# Altium footprint library Connectors THD.PcbLib: 631 footprints (part 19 of 46)
Each footprint in its own frame and in the unit in brackets; x right, y up, seen from the top. Pads: shape width x height; smd on the part's side, far side on the other; paste and mask are expansions set on the pad; w line width, h text height; cw(c..) or ccw(c..) is an arc to the next point about the centre after c.
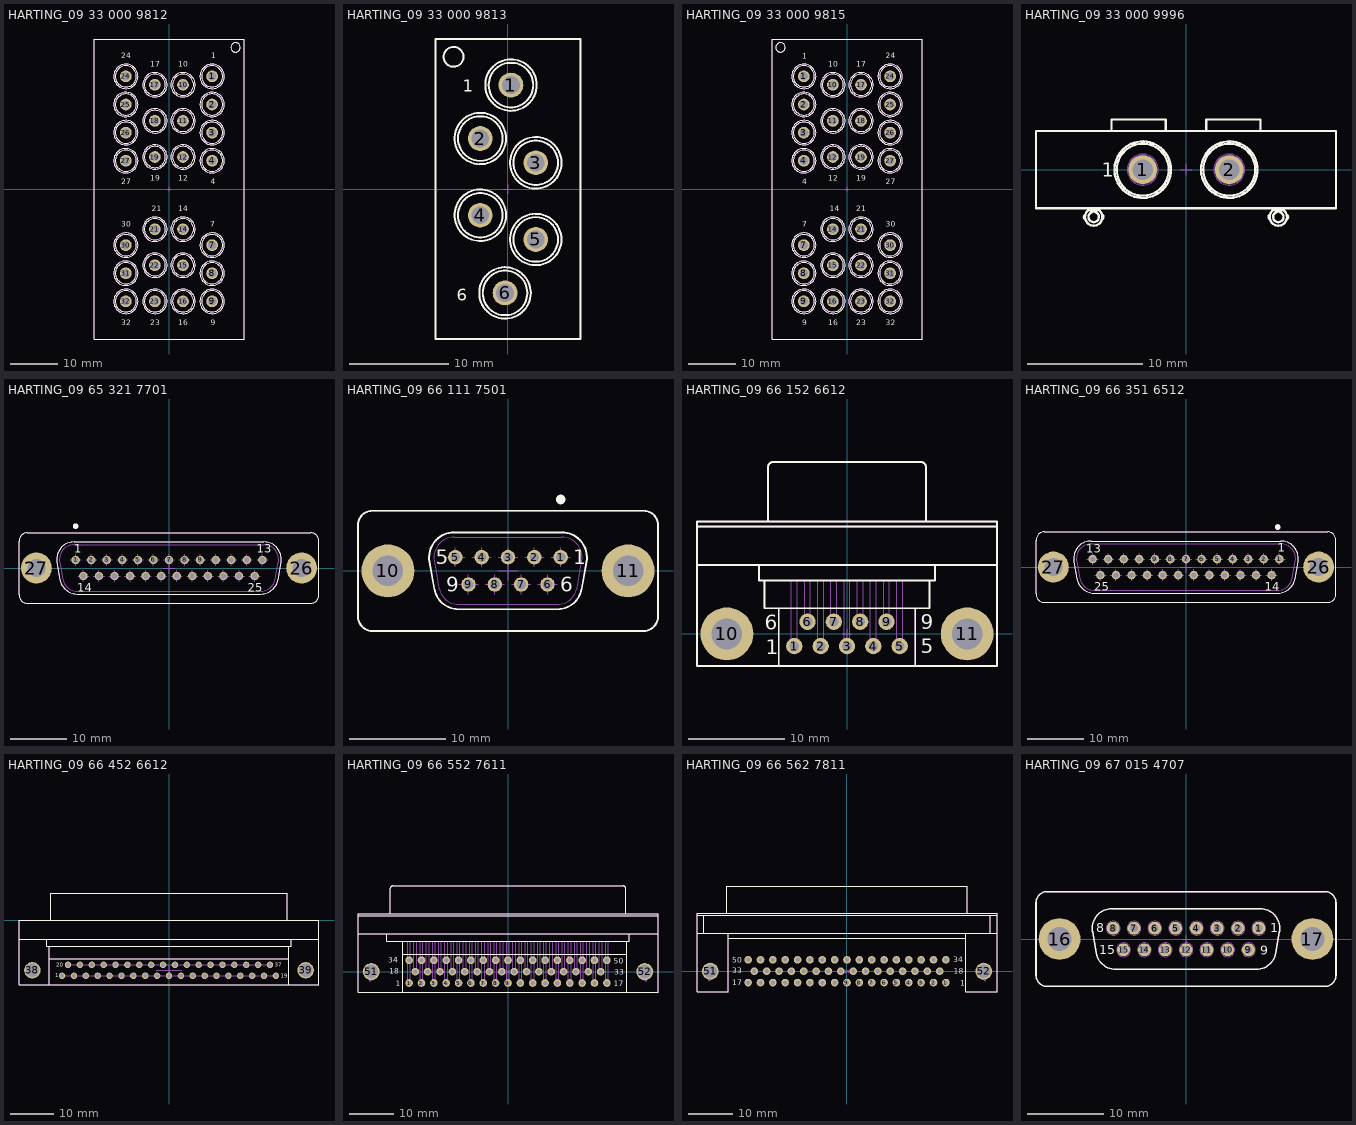
[diagram p18: the footprints below, top view; thin cyan lines are the x and y axes]

## HARTING_09 33 000 9812 [mm] "Han 32EE-f PCB Matrix With Contacts"
height 26
pads (26):
  round 2.5 hole 1.8: 1(9.193,24.026) 2(9.193,18.026) 3(9.193,12.026) 4(9.193,6.026) 7(9.193,-11.974) 8(9.193,-17.974) 9(9.193,-23.974) 10(2.993,22.226) 11(2.993,14.526) 12(2.993,6.826) 14(2.993,-8.574) 15(2.993,-16.274) 16(2.993,-23.974) 17(-3.007,22.226) 18(-3.007,14.526) 19(-3.007,6.826) 21(-3.007,-8.574) 22(-3.007,-16.274) 23(-3.007,-23.974) 24(-9.207,24.026) 25(-9.207,18.026) 26(-9.207,12.026) 27(-9.207,6.026) 30(-9.207,-11.974) 31(-9.207,-17.974) 32(-9.207,-23.974)
Top Overlay:
  circle w0.2: c9.193,-23.974 r2.25
  circle w0.2: c2.993,-23.974 r2.25
  circle w0.2: c-3.007,-23.974 r2.25
  circle w0.2: c-9.207,-23.974 r2.25
  circle w0.2: c-9.207,-17.974 r2.25
  circle w0.2: c-3.007,-16.274 r2.25
  circle w0.2: c2.993,-16.274 r2.25
  circle w0.2: c9.193,-17.974 r2.25
  circle w0.2: c9.193,-11.974 r2.25
  circle w0.2: c-9.207,-11.974 r2.25
  circle w0.2: c-3.007,-8.574 r2.25
  circle w0.2: c2.993,-8.574 r2.25
  circle w0.2: c9.193,6.026 r2.25
  circle w0.2: c2.993,6.826 r2.25
  circle w0.2: c-3.007,6.826 r2.25
  circle w0.2: c-9.207,6.026 r2.25
  circle w0.2: c-9.207,12.026 r2.25
  circle w0.2: c-3.007,14.526 r2.25
  circle w0.2: c9.193,12.026 r2.25
  circle w0.2: c2.993,14.526 r2.25
  circle w0.2: c9.193,18.026 r2.25
  circle w0.2: c9.193,24.026 r2.25
  circle w0.2: c2.993,22.226 r2.25
  circle w0.2: c-3.007,22.226 r2.25
  circle w0.2: c-9.207,24.026 r2.25
  circle w0.2: c-9.207,24.026 r2.6
  circle w0.2: c-3.007,22.226 r2.6
  circle w0.2: c2.993,22.226 r2.6
  circle w0.2: c9.193,24.026 r2.6
  circle w0.2: c9.193,18.026 r2.6
  circle w0.2: c9.193,12.026 r2.6
  circle w0.2: c9.193,6.026 r2.6
  circle w0.2: c2.993,6.826 r2.6
  circle w0.2: c2.993,14.526 r2.6
  circle w0.2: c-3.007,14.526 r2.6
  circle w0.2: c-9.207,12.026 r2.6
  circle w0.2: c-3.007,6.826 r2.6
  circle w0.2: c-9.207,6.026 r2.6
  circle w0.2: c2.993,-8.574 r2.6
  circle w0.2: c9.193,-11.974 r2.6
  circle w0.2: c9.193,-17.974 r2.6
  circle w0.2: c9.193,-23.974 r2.6
  circle w0.2: c2.993,-16.274 r2.6
  circle w0.2: c2.993,-23.974 r2.6
  circle w0.2: c-3.007,-23.974 r2.6
  circle w0.2: c-3.007,-16.274 r2.6
  circle w0.2: c-3.007,-8.574 r2.6
  circle w0.2: c-9.207,-11.974 r2.6
  circle w0.2: c-9.207,-17.974 r2.6
  circle w0.2: c-9.207,-23.974 r2.6
  circle w0.2: c-9.207,18.026 r2.25
  circle w0.2: c-9.207,18.026 r2.6
  circle w0.2: c14.2,30.2 r1
  lines w0.2: -16,-32 16,-32 16,32 -16,32 -16,-32
  text "32" at -10.175,-29.026 h1.2
  text "30" at -10.175,-8.101 h1.2
  text "27" at -10.175,0.974 h1.2
  text "24" at -10.175,27.899 h1.2
  text "1" at 9.05,27.899 h1.2
  text "14" at 2.025,-4.701 h1.2
  text "21" at -3.725,-4.701 h1.2
  text "19" at -3.975,1.774 h1.2
  text "12" at 2.025,1.774 h1.2
  text "17" at -3.975,26.099 h1.2
  text "10" at 2.025,26.099 h1.2
  text "16" at 2.025,-29.026 h1.2
  text "23" at -3.975,-29.026 h1.2
  text "4" at 8.875,0.974 h1.2
  text "7" at 8.825,-8.101 h1.2
  text "9" at 8.875,-29.026 h1.2
Bottom Overlay:
  text "32" at -8.3,-29.026 h1.2
  text "30" at -8.45,-8.125 h1.2
  text "27" at -8.55,0.974 h1.2
  text "24" at -8.225,27.899 h1.2
  text "1" at 9.35,27.899 h1.2
  text "23" at -2.075,-29.026 h1.2
  text "16" at 3.65,-29.026 h1.2
  text "10" at 3.975,26.099 h1.2
  text "17" at -2.025,26.099 h1.2
  text "12" at 3.675,1.774 h1.2
  text "19" at -2.35,1.774 h1.2
  text "21" at -2.25,-4.675 h1.2
  text "14" at 3.75,-4.725 h1.2
  text "4" at 9.75,0.949 h1.2
  text "7" at 9.6,-8.125 h1.2
  text "9" at 9.625,-29.026 h1.2
Mechanical 8:
  lines w0.1: -9.707,-23.974 -9.207,-23.974 ; -9.707,-17.974 -9.207,-17.974 ; -9.707,-11.974 -9.207,-11.974 ; -9.707,6.026 -9.207,6.026 ; -9.707,12.026 -9.207,12.026 ; -9.707,18.026 -9.207,18.026 ; -9.707,24.026 -9.207,24.026 ; -9.207,-24.474 -9.207,-23.974 ; -9.207,-23.474 -9.207,-23.974 ; -9.207,-18.474 -9.207,-17.974 ; -9.207,-17.474 -9.207,-17.974 ; -9.207,-12.474 -9.207,-11.974 ; -9.207,-11.474 -9.207,-11.974 ; -9.207,5.526 -9.207,6.026 ; -9.207,6.526 -9.207,6.026 ; -9.207,11.526 -9.207,12.026 ; -9.207,12.526 -9.207,12.026 ; -9.207,17.526 -9.207,18.026 ; -9.207,18.526 -9.207,18.026 ; -9.207,23.526 -9.207,24.026 ; -9.207,24.526 -9.207,24.026 ; -8.707,-23.974 -9.207,-23.974 ; -8.707,-17.974 -9.207,-17.974 ; -8.707,-11.974 -9.207,-11.974 ; -8.707,6.026 -9.207,6.026 ; -8.707,12.026 -9.207,12.026 ; -8.707,18.026 -9.207,18.026 ; -8.707,24.026 -9.207,24.026 ; -3.507,-23.974 -3.007,-23.974 ; -3.507,-16.274 -3.007,-16.274 ; -3.507,-8.574 -3.007,-8.574 ; -3.507,6.826 -3.007,6.826 ; -3.507,14.526 -3.007,14.526 ; -3.507,22.226 -3.007,22.226 ; -3.007,-24.474 -3.007,-23.974 ; -3.007,-23.474 -3.007,-23.974 ; -3.007,-16.774 -3.007,-16.274 ; -3.007,-15.774 -3.007,-16.274 ; -3.007,-9.074 -3.007,-8.574 ; -3.007,-8.074 -3.007,-8.574 ; -3.007,6.326 -3.007,6.826 ; -3.007,7.326 -3.007,6.826 ; -3.007,14.026 -3.007,14.526 ; -3.007,15.026 -3.007,14.526 ; -3.007,21.726 -3.007,22.226 ; -3.007,22.726 -3.007,22.226 ; -2.507,-23.974 -3.007,-23.974 ; -2.507,-16.274 -3.007,-16.274 ; -2.507,-8.574 -3.007,-8.574 ; -2.507,6.826 -3.007,6.826 ; -2.507,14.526 -3.007,14.526 ; -2.507,22.226 -3.007,22.226 ; -0.5,0 0,0 ; 0,-0.5 0,0 ; 0,0.5 0,0 ; 0.5,0 0,0 ; 2.493,-23.974 2.993,-23.974 ; 2.493,-16.274 2.993,-16.274 ; 2.493,-8.574 2.993,-8.574 ; 2.493,6.826 2.993,6.826 ; 2.493,14.526 2.993,14.526 ; 2.493,22.226 2.993,22.226 ; 2.993,-24.474 2.993,-23.974 ; 2.993,-23.474 2.993,-23.974 ; 2.993,-16.774 2.993,-16.274 ; 2.993,-15.774 2.993,-16.274 ; 2.993,-9.074 2.993,-8.574 ; 2.993,-8.074 2.993,-8.574 ; 2.993,6.326 2.993,6.826 ; 2.993,7.326 2.993,6.826 ; 2.993,14.026 2.993,14.526 ; 2.993,15.026 2.993,14.526 ; 2.993,21.726 2.993,22.226 ; 2.993,22.726 2.993,22.226 ; 3.493,-23.974 2.993,-23.974 ; 3.493,-16.274 2.993,-16.274 ; 3.493,-8.574 2.993,-8.574 ; 3.493,6.826 2.993,6.826 ; 3.493,14.526 2.993,14.526 ; 3.493,22.226 2.993,22.226 ; 8.693,-23.974 9.193,-23.974 ; 8.693,-17.974 9.193,-17.974 ; 8.693,-11.974 9.193,-11.974 ; 8.693,6.026 9.193,6.026 ; 8.693,12.026 9.193,12.026 ; 8.693,18.026 9.193,18.026 ; 8.693,24.026 9.193,24.026 ; 9.193,-24.474 9.193,-23.974 ; 9.193,-23.474 9.193,-23.974 ; 9.193,-18.474 9.193,-17.974 ; 9.193,-17.474 9.193,-17.974 ; 9.193,-12.474 9.193,-11.974 ; 9.193,-11.474 9.193,-11.974 ; 9.193,5.526 9.193,6.026 ; 9.193,6.526 9.193,6.026 ; 9.193,11.526 9.193,12.026 ; 9.193,12.526 9.193,12.026 ; 9.193,17.526 9.193,18.026 ; 9.193,18.526 9.193,18.026 ; 9.193,23.526 9.193,24.026 ; 9.193,24.526 9.193,24.026 ; 9.693,-23.974 9.193,-23.974 ; 9.693,-17.974 9.193,-17.974 ; 9.693,-11.974 9.193,-11.974 ; 9.693,6.026 9.193,6.026 ; 9.693,12.026 9.193,12.026 ; 9.693,18.026 9.193,18.026 ; 9.693,24.026 9.193,24.026
Mechanical 14:
  circle w0.1: c-9.207,12.026 r2.25
  circle w0.1: c-9.207,24.026 r2.25
  circle w0.1: c-9.207,24.026 r2.6
  circle w0.1: c-3.007,22.226 r2.25
  circle w0.1: c2.993,22.226 r2.25
  circle w0.1: c9.193,24.026 r2.25
  circle w0.1: c9.193,18.026 r2.25
  circle w0.1: c9.193,12.026 r2.25
  circle w0.1: c9.193,6.026 r2.25
  circle w0.1: c2.993,6.826 r2.25
  circle w0.1: c2.993,14.526 r2.25
  circle w0.1: c-3.007,14.526 r2.25
  circle w0.1: c-3.007,6.826 r2.25
  circle w0.1: c-9.207,6.026 r2.25
  circle w0.1: c2.993,-8.574 r2.25
  circle w0.1: c9.193,-11.974 r2.25
  circle w0.1: c9.193,-17.974 r2.25
  circle w0.1: c9.193,-23.974 r2.25
  circle w0.1: c2.993,-16.274 r2.25
  circle w0.1: c2.993,-23.974 r2.25
  circle w0.1: c-3.007,-23.974 r2.25
  circle w0.1: c-3.007,-16.274 r2.25
  circle w0.1: c-3.007,-8.574 r2.25
  circle w0.1: c-9.207,-11.974 r2.25
  circle w0.1: c-9.207,-17.974 r2.25
  circle w0.1: c-9.207,-23.974 r2.25
  circle w0.1: c-9.207,18.026 r2.25
  circle w0.1: c-9.207,18.026 r2.6
  circle w0.1: c14.2,30.2 r1
  circle w0.1: c-3.007,22.226 r2.6
  circle w0.1: c2.993,22.226 r2.6
  circle w0.1: c-3.007,14.526 r2.6
  circle w0.1: c2.993,14.526 r2.6
  circle w0.1: c-9.207,12.026 r2.6
  circle w0.1: c9.193,18.026 r2.6
  circle w0.1: c9.193,24.026 r2.6
  circle w0.1: c9.193,12.026 r2.6
  circle w0.1: c9.193,6.026 r2.6
  circle w0.1: c2.993,6.826 r2.6
  circle w0.1: c-3.007,6.826 r2.6
  circle w0.1: c-9.207,6.026 r2.6
  circle w0.1: c-3.007,-8.574 r2.6
  circle w0.1: c2.993,-8.574 r2.6
  circle w0.1: c-9.207,-11.974 r2.6
  circle w0.1: c-9.207,-17.974 r2.6
  circle w0.1: c-9.207,-23.974 r2.6
  circle w0.1: c-3.007,-23.974 r2.6
  circle w0.1: c-3.007,-16.274 r2.6
  circle w0.1: c2.993,-16.274 r2.6
  circle w0.1: c2.993,-23.974 r2.6
  circle w0.1: c9.193,-23.974 r2.6
  circle w0.1: c9.193,-17.974 r2.6
  circle w0.1: c9.193,-11.974 r2.6
  lines w0.1: -16,-32 16,-32 16,32 -16,32 -16,-32
  text "32" at -10.175,-29.026 h1.2
  text "30" at -10.175,-8.101 h1.2
  text "27" at -10.175,0.974 h1.2
  text "24" at -10.175,27.899 h1.2
  text "1" at 9.05,27.899 h1.2
  text "14" at 2.025,-4.701 h1.2
  text "21" at -3.725,-4.701 h1.2
  text "19" at -3.975,1.774 h1.2
  text "12" at 2.025,1.774 h1.2
  text "17" at -3.975,26.099 h1.2
  text "10" at 2.025,26.099 h1.2
  text "16" at 2.025,-29.026 h1.2
  text "23" at -3.975,-29.026 h1.2
  text "4" at 8.875,0.974 h1.2
  text "7" at 8.825,-8.101 h1.2
  text "9" at 8.875,-29.026 h1.2
3D body: height 26, standoff -4.6, extent -16,-32 16,32

## HARTING_09 33 000 9813 [mm] "Han 6E-m PCB Matrix With Contacts"
height 26
pads (6):
  round 2.5 hole 1.8: 1(0.3,10.5) 2(-2.8,5.1) 3(2.8,2.65) 4(-2.8,-2.65) 5(2.8,-5.1) 6(-0.3,-10.5)
Top Overlay:
  circle w0.2: c0.3,10.5 r2.25
  circle w0.2: c0.3,10.5 r2.6
  circle w0.2: c-2.8,5.1 r2.25
  circle w0.2: c-2.8,5.1 r2.6
  circle w0.2: c2.8,2.65 r2.25
  circle w0.2: c2.8,2.65 r2.6
  circle w0.2: c-2.8,-2.65 r2.25
  circle w0.2: c-2.8,-2.65 r2.6
  circle w0.2: c2.8,-5.1 r2.25
  circle w0.2: c2.8,-5.1 r2.6
  circle w0.2: c-0.3,-10.5 r2.25
  circle w0.2: c-0.3,-10.5 r2.6
  circle w0.2: c-5.5,13.35 r1
  lines w0.2: -7.3,-15.15 7.3,-15.15 7.3,15.15 -7.3,15.15 -7.3,-15.15
  text "1" at -4.593,9.824 h1.2
  text "6" at -5.193,-11.276 h1.2
Bottom Overlay:
  text "1" at -4.318,9.824 h1.2
  text "6" at -4.418,-11.276 h1.2
Mechanical 8:
  lines w0.1: -3.3,-2.65 -2.8,-2.65 ; -3.3,5.1 -2.8,5.1 ; -2.8,-3.15 -2.8,-2.65 ; -2.8,-2.15 -2.8,-2.65 ; -2.8,4.6 -2.8,5.1 ; -2.8,5.6 -2.8,5.1 ; -2.3,-2.65 -2.8,-2.65 ; -2.3,5.1 -2.8,5.1 ; -0.8,-10.5 -0.3,-10.5 ; -0.5,0 0,0 ; -0.3,-11 -0.3,-10.5 ; -0.3,-10 -0.3,-10.5 ; -0.2,10.5 0.3,10.5 ; 0,-0.5 0,0 ; 0,0.5 0,0 ; 0.2,-10.5 -0.3,-10.5 ; 0.3,10 0.3,10.5 ; 0.3,11 0.3,10.5 ; 0.5,0 0,0 ; 0.8,10.5 0.3,10.5 ; 2.3,-5.1 2.8,-5.1 ; 2.3,2.65 2.8,2.65 ; 2.8,-5.6 2.8,-5.1 ; 2.8,-4.6 2.8,-5.1 ; 2.8,2.15 2.8,2.65 ; 2.8,3.15 2.8,2.65 ; 3.3,-5.1 2.8,-5.1 ; 3.3,2.65 2.8,2.65
Mechanical 14:
  circle w0.1: c0.3,10.5 r2.25
  circle w0.1: c0.3,10.5 r2.6
  circle w0.1: c-2.8,5.1 r2.25
  circle w0.1: c-2.8,5.1 r2.6
  circle w0.1: c2.8,2.65 r2.25
  circle w0.1: c2.8,2.65 r2.6
  circle w0.1: c-2.8,-2.65 r2.25
  circle w0.1: c-2.8,-2.65 r2.6
  circle w0.1: c2.8,-5.1 r2.25
  circle w0.1: c2.8,-5.1 r2.6
  circle w0.1: c-0.3,-10.5 r2.25
  circle w0.1: c-0.3,-10.5 r2.6
  circle w0.1: c-5.5,13.35 r1
  lines w0.1: -7.3,-15.15 7.3,-15.15 7.3,15.15 -7.3,15.15 -7.3,-15.15
  text "1" at -4.593,9.824 h1.2
  text "6" at -5.193,-11.276 h1.2
3D body: height 26, standoff -4.6, extent -7.3,-15.15 7.3,15.15

## HARTING_09 33 000 9815 [mm] "Han 32EE-m PCB Matrix With Contacts"
height 26
pads (26):
  round 2.5 hole 1.8: 1(-9.207,24.026) 2(-9.207,18.026) 3(-9.207,12.026) 4(-9.207,6.026) 7(-9.207,-11.974) 8(-9.207,-17.974) 9(-9.207,-23.974) 10(-3.007,22.226) 11(-3.007,14.526) 12(-3.007,6.826) 14(-3.007,-8.574) 15(-3.007,-16.274) 16(-3.007,-23.974) 17(2.993,22.226) 18(2.993,14.526) 19(2.993,6.826) 21(2.993,-8.574) 22(2.993,-16.274) 23(2.993,-23.974) 24(9.193,24.026) 25(9.193,18.026) 26(9.193,12.026) 27(9.193,6.026) 30(9.193,-11.974) 31(9.193,-17.974) 32(9.193,-23.974)
Top Overlay:
  circle w0.2: c-14.2,30.2 r1
  circle w0.2: c-9.207,18.026 r2.6
  circle w0.2: c-9.207,18.026 r2.25
  circle w0.2: c-9.207,-23.974 r2.6
  circle w0.2: c-9.207,-17.974 r2.6
  circle w0.2: c-9.207,-11.974 r2.6
  circle w0.2: c-3.007,-8.574 r2.6
  circle w0.2: c-3.007,-16.274 r2.6
  circle w0.2: c-3.007,-23.974 r2.6
  circle w0.2: c2.993,-23.974 r2.6
  circle w0.2: c2.993,-16.274 r2.6
  circle w0.2: c9.193,-23.974 r2.6
  circle w0.2: c9.193,-17.974 r2.6
  circle w0.2: c9.193,-11.974 r2.6
  circle w0.2: c2.993,-8.574 r2.6
  circle w0.2: c-9.207,6.026 r2.6
  circle w0.2: c-3.007,6.826 r2.6
  circle w0.2: c-9.207,12.026 r2.6
  circle w0.2: c-3.007,14.526 r2.6
  circle w0.2: c2.993,14.526 r2.6
  circle w0.2: c2.993,6.826 r2.6
  circle w0.2: c9.193,6.026 r2.6
  circle w0.2: c9.193,12.026 r2.6
  circle w0.2: c9.193,18.026 r2.6
  circle w0.2: c9.193,24.026 r2.6
  circle w0.2: c2.993,22.226 r2.6
  circle w0.2: c-3.007,22.226 r2.6
  circle w0.2: c-9.207,24.026 r2.6
  circle w0.2: c-9.207,24.026 r2.25
  circle w0.2: c-3.007,22.226 r2.25
  circle w0.2: c2.993,22.226 r2.25
  circle w0.2: c9.193,24.026 r2.25
  circle w0.2: c9.193,18.026 r2.25
  circle w0.2: c2.993,14.526 r2.25
  circle w0.2: c9.193,12.026 r2.25
  circle w0.2: c-3.007,14.526 r2.25
  circle w0.2: c-9.207,12.026 r2.25
  circle w0.2: c-9.207,6.026 r2.25
  circle w0.2: c-3.007,6.826 r2.25
  circle w0.2: c2.993,6.826 r2.25
  circle w0.2: c9.193,6.026 r2.25
  circle w0.2: c2.993,-8.574 r2.25
  circle w0.2: c-3.007,-8.574 r2.25
  circle w0.2: c-9.207,-11.974 r2.25
  circle w0.2: c9.193,-11.974 r2.25
  circle w0.2: c9.193,-17.974 r2.25
  circle w0.2: c2.993,-16.274 r2.25
  circle w0.2: c-3.007,-16.274 r2.25
  circle w0.2: c-9.207,-17.974 r2.25
  circle w0.2: c-9.207,-23.974 r2.25
  circle w0.2: c-3.007,-23.974 r2.25
  circle w0.2: c2.993,-23.974 r2.25
  circle w0.2: c9.193,-23.974 r2.25
  lines w0.2: -16,-32 -16,32 16,32 16,-32 -16,-32
  text "7" at -9.575,-8.101 h1.2
  text "30" at 8.225,-8.101 h1.2
  text "4" at -9.525,0.974 h1.2
  text "27" at 8.225,0.974 h1.2
  text "24" at 8.225,27.899 h1.2
  text "9" at -9.525,-29.026 h1.2
  text "32" at 8.225,-29.026 h1.2
  text "1" at -9.525,27.75 h1.2
  text "16" at -3.975,-29.026 h1.2
  text "23" at 2.025,-29.026 h1.2
  text "17" at 2.025,26.099 h1.2
  text "10" at -3.975,26.099 h1.2
  text "19" at 2.025,1.774 h1.2
  text "12" at -3.975,1.774 h1.2
  text "14" at -3.725,-4.701 h1.2
  text "21" at 2.025,-4.701 h1.2
Bottom Overlay:
  text "7" at -8.8,-8.125 h1.2
  text "30" at 9.95,-8.125 h1.2
  text "4" at -8.65,0.949 h1.2
  text "27" at 9.875,0.974 h1.2
  text "24" at 10.175,27.899 h1.2
  text "9" at -8.775,-29.026 h1.2
  text "32" at 10.1,-29.026 h1.2
  text "21" at 3.75,-4.725 h1.2
  text "14" at -2.25,-4.675 h1.2
  text "12" at -2.35,1.774 h1.2
  text "19" at 3.675,1.774 h1.2
  text "10" at -2.025,26.099 h1.2
  text "17" at 3.975,26.099 h1.2
  text "23" at 3.9,-29.026 h1.2
  text "16" at -2.275,-29.026 h1.2
  text "1" at -8.664,27.75 h1.2
Mechanical 8:
  lines w0.1: -9.707,-23.974 -9.207,-23.974 ; -9.707,-17.974 -9.207,-17.974 ; -9.707,-11.974 -9.207,-11.974 ; -9.707,6.026 -9.207,6.026 ; -9.707,12.026 -9.207,12.026 ; -9.707,18.026 -9.207,18.026 ; -9.707,24.026 -9.207,24.026 ; -9.207,-24.474 -9.207,-23.974 ; -9.207,-23.474 -9.207,-23.974 ; -9.207,-18.474 -9.207,-17.974 ; -9.207,-17.474 -9.207,-17.974 ; -9.207,-12.474 -9.207,-11.974 ; -9.207,-11.474 -9.207,-11.974 ; -9.207,5.526 -9.207,6.026 ; -9.207,6.526 -9.207,6.026 ; -9.207,11.526 -9.207,12.026 ; -9.207,12.526 -9.207,12.026 ; -9.207,17.526 -9.207,18.026 ; -9.207,18.526 -9.207,18.026 ; -9.207,23.526 -9.207,24.026 ; -9.207,24.526 -9.207,24.026 ; -8.707,-23.974 -9.207,-23.974 ; -8.707,-17.974 -9.207,-17.974 ; -8.707,-11.974 -9.207,-11.974 ; -8.707,6.026 -9.207,6.026 ; -8.707,12.026 -9.207,12.026 ; -8.707,18.026 -9.207,18.026 ; -8.707,24.026 -9.207,24.026 ; -3.507,-23.974 -3.007,-23.974 ; -3.507,-16.274 -3.007,-16.274 ; -3.507,-8.574 -3.007,-8.574 ; -3.507,6.826 -3.007,6.826 ; -3.507,14.526 -3.007,14.526 ; -3.507,22.226 -3.007,22.226 ; -3.007,-24.474 -3.007,-23.974 ; -3.007,-23.474 -3.007,-23.974 ; -3.007,-16.774 -3.007,-16.274 ; -3.007,-15.774 -3.007,-16.274 ; -3.007,-9.074 -3.007,-8.574 ; -3.007,-8.074 -3.007,-8.574 ; -3.007,6.326 -3.007,6.826 ; -3.007,7.326 -3.007,6.826 ; -3.007,14.026 -3.007,14.526 ; -3.007,15.026 -3.007,14.526 ; -3.007,21.726 -3.007,22.226 ; -3.007,22.726 -3.007,22.226 ; -2.507,-23.974 -3.007,-23.974 ; -2.507,-16.274 -3.007,-16.274 ; -2.507,-8.574 -3.007,-8.574 ; -2.507,6.826 -3.007,6.826 ; -2.507,14.526 -3.007,14.526 ; -2.507,22.226 -3.007,22.226 ; -0.5,0 0,0 ; 0,-0.5 0,0 ; 0,0.5 0,0 ; 0.5,0 0,0 ; 2.493,-23.974 2.993,-23.974 ; 2.493,-16.274 2.993,-16.274 ; 2.493,-8.574 2.993,-8.574 ; 2.493,6.826 2.993,6.826 ; 2.493,14.526 2.993,14.526 ; 2.493,22.226 2.993,22.226 ; 2.993,-24.474 2.993,-23.974 ; 2.993,-23.474 2.993,-23.974 ; 2.993,-16.774 2.993,-16.274 ; 2.993,-15.774 2.993,-16.274 ; 2.993,-9.074 2.993,-8.574 ; 2.993,-8.074 2.993,-8.574 ; 2.993,6.326 2.993,6.826 ; 2.993,7.326 2.993,6.826 ; 2.993,14.026 2.993,14.526 ; 2.993,15.026 2.993,14.526 ; 2.993,21.726 2.993,22.226 ; 2.993,22.726 2.993,22.226 ; 3.493,-23.974 2.993,-23.974 ; 3.493,-16.274 2.993,-16.274 ; 3.493,-8.574 2.993,-8.574 ; 3.493,6.826 2.993,6.826 ; 3.493,14.526 2.993,14.526 ; 3.493,22.226 2.993,22.226 ; 8.693,-23.974 9.193,-23.974 ; 8.693,-17.974 9.193,-17.974 ; 8.693,-11.974 9.193,-11.974 ; 8.693,6.026 9.193,6.026 ; 8.693,12.026 9.193,12.026 ; 8.693,18.026 9.193,18.026 ; 8.693,24.026 9.193,24.026 ; 9.193,-24.474 9.193,-23.974 ; 9.193,-23.474 9.193,-23.974 ; 9.193,-18.474 9.193,-17.974 ; 9.193,-17.474 9.193,-17.974 ; 9.193,-12.474 9.193,-11.974 ; 9.193,-11.474 9.193,-11.974 ; 9.193,5.526 9.193,6.026 ; 9.193,6.526 9.193,6.026 ; 9.193,11.526 9.193,12.026 ; 9.193,12.526 9.193,12.026 ; 9.193,17.526 9.193,18.026 ; 9.193,18.526 9.193,18.026 ; 9.193,23.526 9.193,24.026 ; 9.193,24.526 9.193,24.026 ; 9.693,-23.974 9.193,-23.974 ; 9.693,-17.974 9.193,-17.974 ; 9.693,-11.974 9.193,-11.974 ; 9.693,6.026 9.193,6.026 ; 9.693,12.026 9.193,12.026 ; 9.693,18.026 9.193,18.026 ; 9.693,24.026 9.193,24.026
Mechanical 14:
  circle w0.1: c-14.2,30.2 r1
  circle w0.1: c9.193,-11.974 r2.6
  circle w0.1: c9.193,-17.974 r2.6
  circle w0.1: c9.193,-23.974 r2.6
  circle w0.1: c2.993,-23.974 r2.6
  circle w0.1: c2.993,-16.274 r2.6
  circle w0.1: c-3.007,-16.274 r2.6
  circle w0.1: c-3.007,-23.974 r2.6
  circle w0.1: c-9.207,-23.974 r2.6
  circle w0.1: c-9.207,-17.974 r2.6
  circle w0.1: c-9.207,-11.974 r2.6
  circle w0.1: c2.993,-8.574 r2.6
  circle w0.1: c-3.007,-8.574 r2.6
  circle w0.1: c-9.207,6.026 r2.6
  circle w0.1: c-3.007,6.826 r2.6
  circle w0.1: c2.993,6.826 r2.6
  circle w0.1: c9.193,6.026 r2.6
  circle w0.1: c9.193,12.026 r2.6
  circle w0.1: c9.193,24.026 r2.6
  circle w0.1: c9.193,18.026 r2.6
  circle w0.1: c-9.207,12.026 r2.6
  circle w0.1: c2.993,14.526 r2.6
  circle w0.1: c-3.007,14.526 r2.6
  circle w0.1: c2.993,22.226 r2.6
  circle w0.1: c-3.007,22.226 r2.6
  circle w0.1: c-9.207,18.026 r2.6
  circle w0.1: c-9.207,18.026 r2.25
  circle w0.1: c-9.207,-23.974 r2.25
  circle w0.1: c-9.207,-17.974 r2.25
  circle w0.1: c-9.207,-11.974 r2.25
  circle w0.1: c-3.007,-8.574 r2.25
  circle w0.1: c-3.007,-16.274 r2.25
  circle w0.1: c-3.007,-23.974 r2.25
  circle w0.1: c2.993,-23.974 r2.25
  circle w0.1: c2.993,-16.274 r2.25
  circle w0.1: c9.193,-23.974 r2.25
  circle w0.1: c9.193,-17.974 r2.25
  circle w0.1: c9.193,-11.974 r2.25
  circle w0.1: c2.993,-8.574 r2.25
  circle w0.1: c-9.207,6.026 r2.25
  circle w0.1: c-3.007,6.826 r2.25
  circle w0.1: c-3.007,14.526 r2.25
  circle w0.1: c2.993,14.526 r2.25
  circle w0.1: c2.993,6.826 r2.25
  circle w0.1: c9.193,6.026 r2.25
  circle w0.1: c9.193,12.026 r2.25
  circle w0.1: c9.193,18.026 r2.25
  circle w0.1: c9.193,24.026 r2.25
  circle w0.1: c2.993,22.226 r2.25
  circle w0.1: c-3.007,22.226 r2.25
  circle w0.1: c-9.207,24.026 r2.6
  circle w0.1: c-9.207,24.026 r2.25
  circle w0.1: c-9.207,12.026 r2.25
  lines w0.1: -16,-32 -16,32 16,32 16,-32 -16,-32
  text "7" at -9.575,-8.101 h1.2
  text "30" at 8.225,-8.101 h1.2
  text "4" at -9.525,0.974 h1.2
  text "27" at 8.225,0.974 h1.2
  text "24" at 8.225,27.899 h1.2
  text "9" at -9.525,-29.026 h1.2
  text "32" at 8.225,-29.026 h1.2
  text "1" at -9.525,27.75 h1.2
  text "16" at -3.975,-29.026 h1.2
  text "23" at 2.025,-29.026 h1.2
  text "17" at 2.025,26.099 h1.2
  text "10" at -3.975,26.099 h1.2
  text "19" at 2.025,1.774 h1.2
  text "12" at -3.975,1.774 h1.2
  text "14" at -3.725,-4.701 h1.2
  text "21" at 2.025,-4.701 h1.2
3D body: height 26, standoff -4.6, extent -16,-32 16,32
